# Altium schematic symbol library relay.SCHLIB: 425 symbols (part 1 of 3) (continued)
## GN?*210A
designator K?, comment ULTRA-SMALL PACKAGE SLIM POLARIZED RELAY NAiS   Source: http://www.mew-europe.com/..  en_ds_61007_0000.pdf  (value not drawn)
MPN: AGN210A03; MPN: AGN210A12; MPN: AGN210A4H; MF: AROMAT/ MATSUSHITA; OC_FARNELL: unknown; OC_NEWARK: 15P8571; OC_NEWARK: unknown; OC_NEWARK: 10C3303; OC_NEWARK: 15P8573
footprint GN-A
part A pins: 1 -, 8 +
part B pins: 2 O, 3 P, 4 S
part C pins: 5 S, 6 P, 7 O

## GN?*210S
designator K?, comment ULTRA-SMALL PACKAGE SLIM POLARIZED RELAY NAiS   Source: http://www.mew-europe.com/..  en_ds_61007_0000.pdf  (value not drawn)
MPN: AGN210S03; MPN: AGN210S12; MF: AROMAT/ MATSUSHITA; OC_FARNELL: unknown; OC_NEWARK: 15P8575; OC_NEWARK: unknown; OC_NEWARK: 10C3320
footprint GN-S
part A pins: 1 -, 8 +
part B pins: 2 O, 3 P, 4 S
part C pins: 5 S, 6 P, 7 O

## GQ?*200
designator K?, comment ULTRA-SMALL PACKAGE FLAT POLARIZED RELAY NAiS   Source: http://www.mew-europe.com/..  en_ds_61008_0000.pdf  (value not drawn)
MPN: AGQ20003; MPN: AGQ20006; MPN: AGQ20009; MPN: AGQ20012; MPN: AGQ20024; MPN: AGQ2004H; MF: AROMAT/ MATSUSHITA; OC_FARNELL: unknown; OC_NEWARK: 13P0847; OC_NEWARK: 10C3360; OC_NEWARK: 10C3361; OC_FARNELL: 3104825; OC_NEWARK: 13P0849; OC_NEWARK: unknown; OC_NEWARK: 13P0850; OC_FARNELL: 3104813; OC_NEWARK: 13P0851
footprint GQ
part A pins: 1 +, 8 -
part B pins: 2 O, 3 P, 4 S
part C pins: 5 S, 6 P, 7 O

## GQ?*200A
designator K?, comment ULTRA-SMALL PACKAGE FLAT POLARIZED RELAY NAiS   Source: http://www.mew-europe.com/..  en_ds_61008_0000.pdf  (value not drawn)
MPN: AGQ200A03; MPN: AGQ200A09Z; MPN: AGQ200A12; MPN: AGQ200A24; MPN: AGQ200A4H; MF: AROMAT/ MATSUSHITA; OC_FARNELL: 1448336; OC_NEWARK: 13P0835; OC_FARNELL: unknown; OC_NEWARK: unknown; OC_NEWARK: 10C3339; OC_FARNELL: 3104849; OC_NEWARK: 13P0836; OC_FARNELL: 1448337; OC_NEWARK: 13P0837; OC_FARNELL: 3104837; OC_NEWARK: 13P0838
footprint GN-A
part A pins: 1 +, 8 -
part B pins: 2 O, 3 P, 4 S
part C pins: 5 S, 6 P, 7 O

## GQ?*200S
designator K?, comment ULTRA-SMALL PACKAGE FLAT POLARIZED RELAY NAiS   Source: http://www.mew-europe.com/..  en_ds_61008_0000.pdf  (value not drawn)
MPN: AGQ200S03; MPN: AGQ200S12; MPN: AGQ200S1H; MPN: AGQ200S24; MPN: AGQ200S4H; MF: AROMAT/ MATSUSHITA; OC_FARNELL: unknown; OC_NEWARK: 10C3345; OC_NEWARK: unknown; OC_NEWARK: 10C3353; OC_NEWARK: 13P0842; OC_NEWARK: 10C3355; OC_NEWARK: 10C3357
footprint GN-S
part A pins: 1 +, 8 -
part B pins: 2 O, 3 P, 4 S
part C pins: 5 S, 6 P, 7 O

## GQ?*210
designator K?, comment ULTRA-SMALL PACKAGE FLAT POLARIZED RELAY NAiS   Source: http://www.mew-europe.com/..  en_ds_61008_0000.pdf  (value not drawn)
MPN: AGQ21003; MPN: AGQ21009; MPN: AGQ2101H; MPN: AGQ21024; MPN: AGQ2104H; MF: AROMAT/ MATSUSHITA; OC_FARNELL: unknown; OC_NEWARK: 10C3391; OC_NEWARK: unknown; OC_NEWARK: 15P8586; OC_NEWARK: 10C3394; OC_NEWARK: 10C3396; OC_NEWARK: 15P8587
footprint GQ
part A pins: 1 -, 8 +
part B pins: 2 O, 3 P, 4 S
part C pins: 5 S, 6 P, 7 O

## GQ?*210A
designator K?, comment ULTRA-SMALL PACKAGE FLAT POLARIZED RELAY NAiS   Source: http://www.mew-europe.com/..  en_ds_61008_0000.pdf  (value not drawn)
MPN: AGQ210A03; MPN: AGQ210A1H; MPN: AGQ210A4H; OC_FARNELL: unknown; OC_NEWARK: 15P8580; OC_NEWARK: unknown; OC_NEWARK: 15P8581; OC_NEWARK: 15P8582
footprint GQ-A
part A pins: 1 -, 8 +
part B pins: 2 O, 3 P, 4 S
part C pins: 5 S, 6 P, 7 O

## GQ?*210S
designator K?, comment ULTRA-SMALL PACKAGE FLAT POLARIZED RELAY NAiS   Source: http://www.mew-europe.com/..  en_ds_61008_0000.pdf  (value not drawn)
MPN: AGQ210S4H; OC_FARNELL: unknown; OC_NEWARK: unknown; OC_NEWARK: 15P8583
footprint GN-S
part A pins: 1 -, 8 +
part B pins: 2 O, 3 P, 4 S
part C pins: 5 S, 6 P, 7 O

## H550
designator K?, comment RELAY   bistable, 1 x switch, high current  (value not drawn)
OC_FARNELL: unknown; OC_NEWARK: unknown
footprint H550
part A pins: 1, 2, 3
part B pins: O0 O, O1 O@1, P0 P@1, P1 P, S0 S, S1 S@1

## HE751
designator K?, comment RELAY   reed, 1 x norm. open, Hamlin  (value not drawn)
OC_FARNELL: unknown; OC_NEWARK: unknown
footprint HE751
part A pins: 2 1, 6 2
part B pins: 8 P, 14 S

## HE3321
designator K?, comment RELAY   reed, 1 x norm. open, 7.62 mm, grid 5.08 mm, Hamlin  (value not drawn)
MPN: HE3321C1200; MF: HAMLIN; OC_FARNELL: unknown; OC_NEWARK: 46F3928
footprint HE3321
part A pins: 2 1, 3 2
part B pins: 1 P, 4 S

## HE3621
designator K?, comment RELAY   reed, 1 x norm. open, grid 5.08 mm, Hamlin  (value not drawn)
MPN: HE3621A2410; MF: HAMLIN; OC_FARNELL: 9561943; OC_NEWARK: 50F7993
footprint HE3621
part A pins: 2 +, 3 -
part B pins: 1 S, 4 P

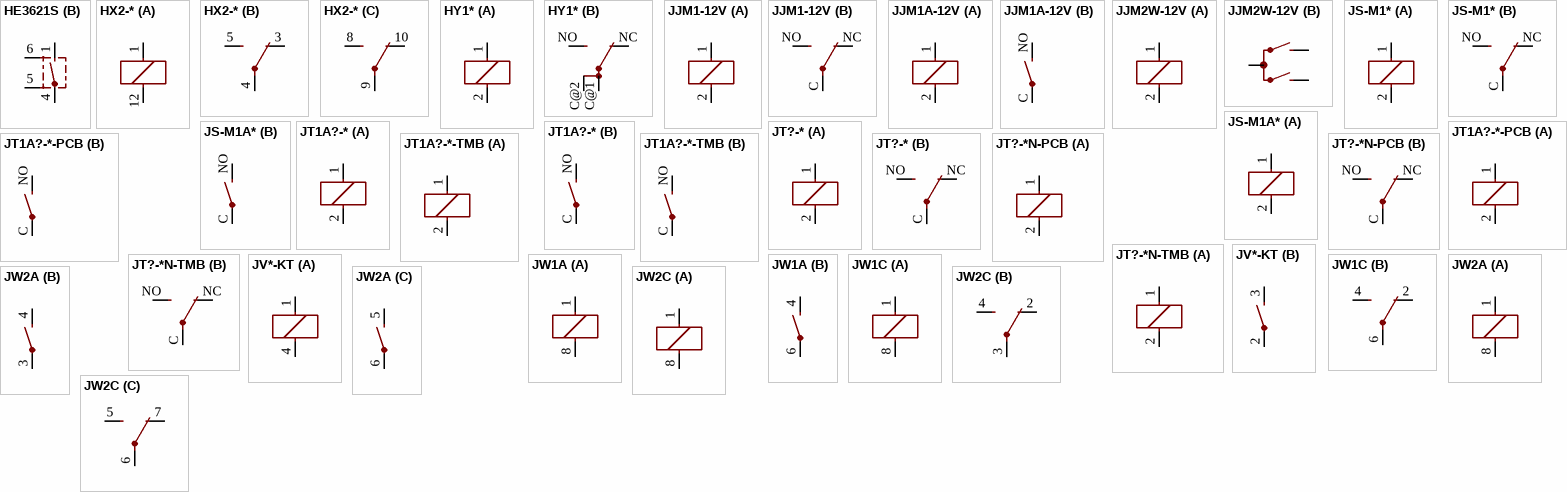
[diagram p10: symbols HE3621S to JW2C]

## HE3621S
designator K?, comment RELAY   reed, 1 x norm. open with shield, grid 5.08 mm, Hamlin  (value not drawn)
OC_FARNELL: unknown; OC_NEWARK: unknown
footprint HE3621S
part A pins: 2 +, 3 -
part B pins: 1 S, 4 P, 5 ES@1, 6 ES@2

## HX2-*
designator K?, comment Compact & Slim 2 Form C Non-polarized Relay NAiS   Source: http://www.mew-europe.com/..  en_ds_61011_0000.pdf  (value not drawn)
OC_FARNELL: unknown; OC_NEWARK: unknown
footprint HX
part A pins: 1, 12 2
part B pins: 3 O, 4 P, 5 S
part C pins: 8 S, 9 P, 10 O

## HY1*
designator K?, comment Non-polarized 1 Form C Relay NAiS   Source: http://www.mew-europe.com/..  en_ds_61012_0000.pdf  (value not drawn)
MPN: HY1-12V; MPN: HY1-24V; MPN: HY1-3V; MPN: HY1-5V; MPN: HY1-6V; MPN: HY1-9V; MPN: HY1Z-12V; MPN: HY1Z-24V; MPN: HY1Z-4.5V; MPN: HY1Z-5V; MPN: HY1Z-9V; MF: AROMAT/ MATSUSHITA; OC_FARNELL: unknown; OC_NEWARK: unknown; OC_NEWARK: 10C6688; OC_NEWARK: 10C6689; OC_NEWARK: 10C6690; OC_NEWARK: 10C6692; OC_NEWARK: 10C6693; OC_NEWARK: 10C6694; OC_NEWARK: 10C6704; OC_NEWARK: 10C6705; OC_NEWARK: 10C6707; OC_NEWARK: 52F9234; OC_NEWARK: 10C6709
footprint HY
part A pins: 1, 2
part B pins: C@1 P, C@2 P@1, NC O, NO S

## JJM1-12V
designator K?, comment HALF-SIZE AUTOMOTIVE RELAY NAiS   Source: http://www.mew-europe.com/.. en_ds_61210_0001.pdf  (value not drawn)
MPN: JJM1-12V; MF: AROMAT/ MATSUSHITA; OC_FARNELL: unknown; OC_NEWARK: 10C7318
footprint JJM1C
part A pins: 1, 2
part B pins: C P, NC O, NO S

## JJM1A-12V
designator K?, comment HALF-SIZE AUTOMOTIVE RELAY NAiS   Source: http://www.mew-europe.com/.. en_ds_61210_0001.pdf  (value not drawn)
OC_FARNELL: unknown; OC_NEWARK: unknown
footprint JJM1A
part A pins: 1, 2
part B pins: C P, NO S

## JJM2W-12V
designator K?, comment DOUBLE MAKE CONTACT AUTOMOTIVE RELAY NAiS   Source: http://www.mew-europe.com/.. en_ds_61210_0002.pdf  (value not drawn)
OC_FARNELL: unknown; OC_NEWARK: unknown
footprint JJM
part A pins: 1, 2
part B pins: C, NO1, NO2

## JS-M1*
designator K?, comment Automotive Ultra-Miniature Power Relay NAiS   Source: http://www.mew-europe.com/.. en_ds_61211_0000.pdf  (value not drawn)
MPN: JSM1-12V-4; MPN: JSM1-12V-5; MF: FARNELL; OC_FARNELL: 910338; OC_NEWARK: 13P4552; OC_FARNELL: 910351; OC_NEWARK: 14J1764; OC_FARNELL: unknown; OC_NEWARK: unknown
footprint JS-M
part A pins: 1, 2
part B pins: C P, NC O, NO S

## JS-M1A*
designator K?, comment Automotive Ultra-Miniature Power Relay NAiS   Source: http://www.mew-europe.com/.. en_ds_61211_0000.pdf  (value not drawn)
MPN: JSM1A-12V-4; MPN: JSM1A-12V-5; OC_FARNELL: unknown; OC_NEWARK: 13P4554; OC_NEWARK: 13P4555; OC_NEWARK: unknown
footprint JS-M1A
part A pins: 1, 2
part B pins: C P, NO S

## JT1A?-*
designator K?, comment COMPACT ECONOMICAL 30 AMP. RELAY NAiS   Source: http://www.mew-europe.com/.. en_ds_61212_0000.pdf  (value not drawn)
OC_FARNELL: unknown; OC_NEWARK: unknown
footprint JT1A
part A pins: 1, 2
part B pins: C P, NO S

## JT1A?-*-PCB
designator K?, comment COMPACT ECONOMICAL 30 AMP. RELAY NAiS   Source: http://www.mew-europe.com/.. en_ds_61212_0000.pdf  (value not drawn)
OC_FARNELL: unknown; OC_NEWARK: unknown
footprint JT1A-PCB
part A pins: 1, 2
part B pins: C P, NO S

## JT1A?-*-TMB
designator K?, comment COMPACT ECONOMICAL 30 AMP. RELAY NAiS   Source: http://www.mew-europe.com/.. en_ds_61212_0000.pdf  (value not drawn)
OC_FARNELL: unknown; OC_NEWARK: unknown
footprint JT1A-TMB
part A pins: 1, 2
part B pins: C P, NO S

## JT?-*
designator K?, comment COMPACT ECONOMICAL 30 AMP. RELAY NAiS   Source: http://www.mew-europe.com/.. en_ds_61212_0000.pdf  (value not drawn)
OC_FARNELL: unknown; OC_NEWARK: unknown
footprint JT
part A pins: 1, 2
part B pins: C P, NC O, NO S

## JT?-*N-PCB
designator K?, comment COMPACT ECONOMICAL 30 AMP. RELAY NAiS   Source: http://www.mew-europe.com/.. en_ds_61212_0000.pdf  (value not drawn)
OC_FARNELL: unknown; OC_NEWARK: unknown
footprint JT-PCB
part A pins: 1, 2
part B pins: C P, NC O, NO S

## JT?-*N-TMB
designator K?, comment COMPACT ECONOMICAL 30 AMP. RELAY NAiS   Source: http://www.mew-europe.com/.. en_ds_61212_0000.pdf  (value not drawn)
OC_FARNELL: unknown; OC_NEWARK: unknown
footprint JT-TMB
part A pins: 1, 2
part B pins: C P, NC O, NO S

## JV*-KT
designator K?, comment POWER RELAY JV SERIES 1 POLEâ€”5 A (MEDIUM LOAD CONTROL)    Source:  Data sheet  (value not drawn)
footprint JV-KT
part A pins: 1, 4 2
part B pins: 2 P, 3 S

## JW1A
designator K?, comment Power relay   Source: Panasonic Electric Works Co., Ltd. / jw.catalog.pdf  (value not drawn)
footprint JW1A
part A pins: 1, 8 2
part B pins: 4 S, 6 P

## JW1C
designator K?, comment Power relay   Source: Panasonic Electric Works Co., Ltd. / jw.catalog.pdf  (value not drawn)
footprint JW1C
part A pins: 1, 8 2
part B pins: 2 O, 4 S, 6 P

## JW2A
designator K?, comment Power relay   Source: Panasonic Electric Works Co., Ltd. / jw.catalog.pdf  (value not drawn)
footprint JW2A
part A pins: 1, 8 2
part B pins: 3 P, 4 S
part C pins: 5 S, 6 P

## JW2C
designator K?, comment Power relay   Source: Panasonic Electric Works Co., Ltd. / jw.catalog.pdf  (value not drawn)
footprint JW2C
part A pins: 1, 8 2
part B pins: 2 O, 3 P, 4 S
part C pins: 5 S, 6 P, 7 O

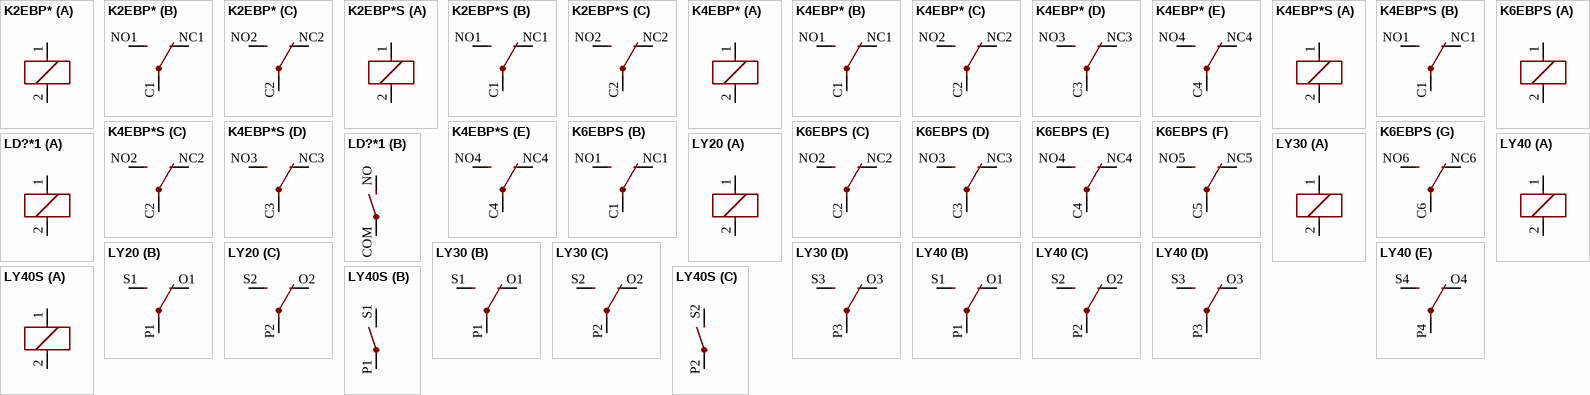
[diagram p11: symbols K2EBP* to LY40S]

## K2EBP*
designator K?, comment UNIQUELY DESIGNED RELAY NAiS   Source: http://www.mew-europe.com/..  en_ds_61013_0000.pdf  (value not drawn)
OC_FARNELL: unknown; OC_NEWARK: unknown
footprint K2EBP
part A pins: 1, 2
part B pins: C1 P, NC1 O, NO1 S
part C pins: C2 P, NC2 O, NO2 S

## K2EBP*S
designator K?, comment UNIQUELY DESIGNED RELAY NAiS   Source: http://www.mew-europe.com/..  en_ds_61013_0000.pdf  (value not drawn)
OC_FARNELL: unknown; OC_NEWARK: unknown
footprint K2-PS
part A pins: 1, 2
part B pins: C1 P, NC1 O, NO1 S
part C pins: C2 P, NC2 O, NO2 S

## K4EBP*
designator K?, comment UNIQUELY DESIGNED RELAY NAiS   Source: http://www.mew-europe.com/..  en_ds_61013_0000.pdf  (value not drawn)
OC_FARNELL: unknown; OC_NEWARK: unknown
footprint K4EBP
part A pins: 1, 2
part B pins: C1 P, NC1 O, NO1 S
part C pins: C2 P, NC2 O, NO2 S
part D pins: C3 P, NC3 O, NO3 S
part E pins: C4 P, NC4 O, NO4 S

## K4EBP*S
designator K?, comment UNIQUELY DESIGNED RELAY NAiS   Source: http://www.mew-europe.com/..  en_ds_61013_0000.pdf  (value not drawn)
OC_FARNELL: unknown; OC_NEWARK: unknown
footprint K4-PS
part A pins: 1, 2
part B pins: C1 P, NC1 O, NO1 S
part C pins: C2 P, NC2 O, NO2 S
part D pins: C3 P, NC3 O, NO3 S
part E pins: C4 P, NC4 O, NO4 S

## K6EBPS
designator K?, comment RELAY Socked NAiS   Source: http://www.mew-europe.com/..  en_ds_61013_0000.pdf  (value not drawn)
OC_FARNELL: unknown; OC_NEWARK: unknown
footprint K6-PS
part A pins: 1, 2
part B pins: C1 P, NC1 O, NO1 S
part C pins: C2 P, NC2 O, NO2 S
part D pins: C3 P, NC3 O, NO3 S
part E pins: C4 P, NC4 O, NO4 S
part F pins: C5 P, NC5 O, NO5 S
part G pins: C6 P, NC6 O, NO6 S

## LD?*1
designator K?, comment Slim Power Relay NAiS   Source: http://www.mew-europe.com/..  en_ds_61112_0000.pdf  (value not drawn)
MPN: ALD112; MF: FARNELL; OC_FARNELL: 3727154; OC_NEWARK: unknown; OC_FARNELL: unknown; OC_FARNELL: 3727166; OC_NEWARK: 70C6003; OC_FARNELL: 3727178
footprint LD
part A pins: 1, 2
part B pins: COM P, NO S

## LY20
designator K?, comment RELAY   2 x switch, Omron  (value not drawn)
OC_FARNELL: unknown; OC_NEWARK: unknown
footprint LY20
part A pins: 1, 2
part B pins: O1 O, P1 P, S1 S
part C pins: O2 O, P2 P, S2 S

## LY30
designator K?, comment RELAY   3 x switch, Omron  (value not drawn)
OC_FARNELL: unknown; OC_NEWARK: unknown
footprint LY30
part A pins: 1, 2
part B pins: O1 O, P1 P, S1 S
part C pins: O2 O, P2 P, S2 S
part D pins: O3 O, P3 P, S3 S

## LY40
designator K?, comment RELAY   4 x switch, Omron  (value not drawn)
OC_FARNELL: unknown; OC_NEWARK: unknown
footprint LY40
part A pins: 1, 2
part B pins: O1 O, P1 P, S1 S
part C pins: O2 O, P2 P, S2 S
part D pins: O3 O, P3 P, S3 S
part E pins: O4 O, P4 P, S4 S

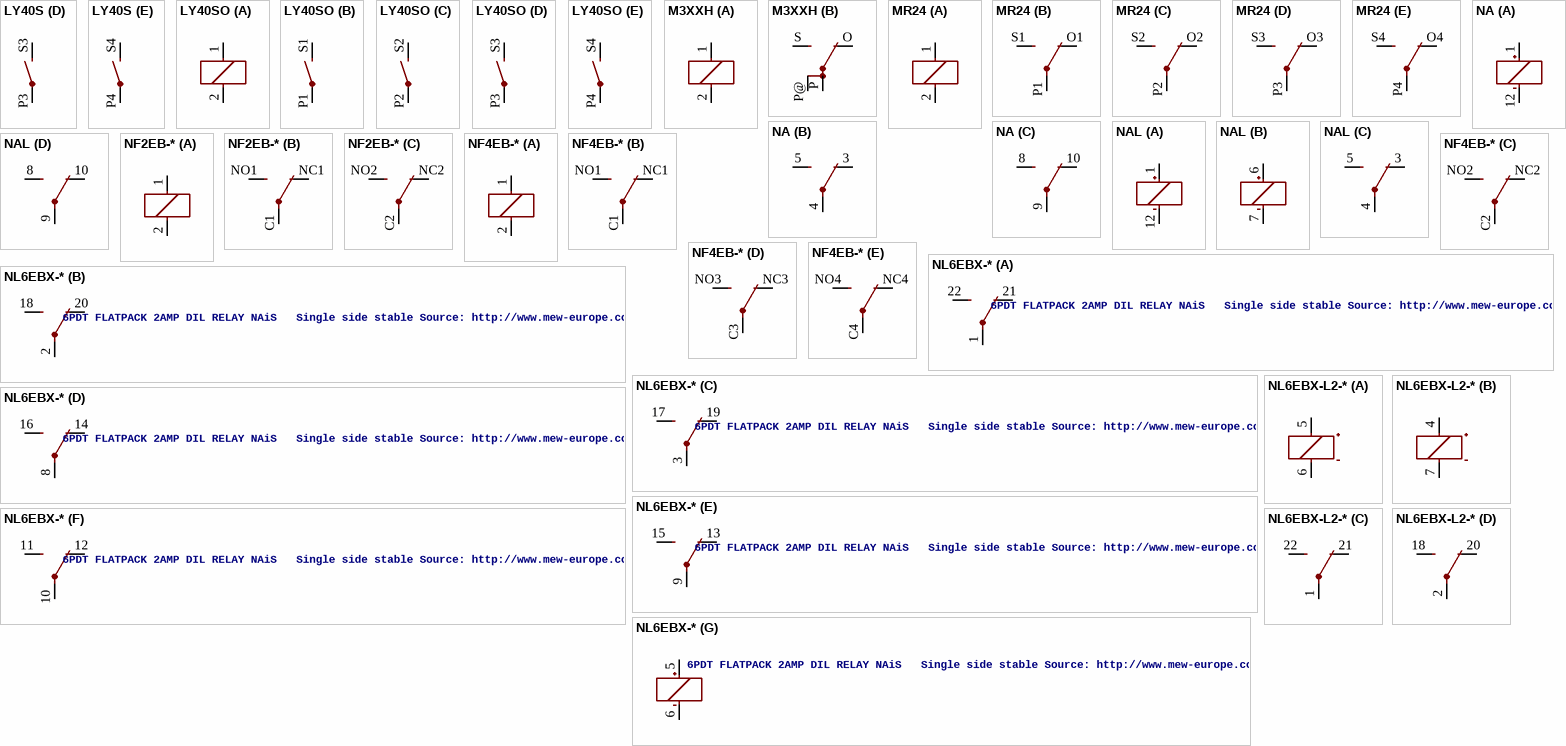
[diagram p12: symbols LY40S to NL6EBX-L2-*]

## LY40S
designator K?, comment RELAY   4 x switch, Omron  (value not drawn)
OC_FARNELL: unknown; OC_NEWARK: unknown
footprint LY40S
part A pins: 1, 2
part B pins: P1 P, S1 S
part C pins: P2 P, S2 S
part D pins: P3 P, S3 S
part E pins: P4 P, S4 S

## LY40SO
designator K?, comment RELAY   4 x norm. open, Omron  (value not drawn)
OC_FARNELL: unknown; OC_NEWARK: unknown
footprint LY40SO
part A pins: 1, 2
part B pins: P1 P, S1 S
part C pins: P2 P, S2 S
part D pins: P3 P, S3 S
part E pins: P4 P, S4 S

## M3XXH
designator K?, comment RELAY   1 x switch  (value not drawn)
OC_FARNELL: unknown; OC_NEWARK: unknown
footprint M3XXH
part A pins: 1, 2
part B pins: O, P, P@ P@1, S

## MR24
designator K?, comment RELAY   4 x switch  (value not drawn)
OC_FARNELL: unknown; OC_NEWARK: unknown
footprint MR24
part A pins: 1, 2
part B pins: O1 O, P1 P, S1 S
part C pins: O2 O, P2 P, S2 S
part D pins: O3 O, P3 P, S3 S
part E pins: O4 O, P4 P, S4 S

## NA
designator K?, comment RELAY  (value not drawn)
OC_FARNELL: unknown; OC_NEWARK: unknown
footprint NA
part A pins: 1 +, 12 -
part B pins: 3 O, 4 P, 5 S
part C pins: 8 S, 9 P, 10 O

## NAL
designator K?, comment RELAY  (value not drawn)
OC_FARNELL: unknown; OC_NEWARK: unknown
footprint NAL
part A pins: 1 +, 12 -
part B pins: 6 +, 7 -
part C pins: 3 O, 4 P, 5 S
part D pins: 8 S, 9 P, 10 O

## NF2EB-*
designator K?, comment FLATPACK RELAY NAiS   Source: http://www.mew-europe.com/..  en_ds_61014_0000.pdf  (value not drawn)
MPN: NF2EB-12V; MPN: NF2EB-24V; MPN: NF2EB-5V; MPN: NF2EB-6V; OC_FARNELL: 1200946; OC_NEWARK: 13P5536; OC_FARNELL: 1175714; OC_NEWARK: 13P5537; OC_FARNELL: unknown; OC_NEWARK: unknown; OC_FARNELL: 1703747; OC_NEWARK: 13P5538; OC_NEWARK: 13P5539
footprint NF2
part A pins: 1, 2
part B pins: C1 P, NC1 O, NO1 S
part C pins: C2 P, NC2 O, NO2 S

## NF4EB-*
designator K?, comment FLATPACK RELAY NAiS   Source: http://www.mew-europe.com/..  en_ds_61014_0000.pdf  (value not drawn)
MPN: NF4EB-12V; MPN: NF4EB-24V; MPN: NF4EB-48V; MPN: NF4EB-5V; MPN: NF4EB-6V; MF: AROMAT/ MATSUSHITA; OC_FARNELL: 1175715; OC_NEWARK: 13P5540; OC_FARNELL: 1373470; OC_NEWARK: 13P5541; OC_FARNELL: unknown; OC_NEWARK: 13P5542; OC_FARNELL: 1200947; OC_NEWARK: 13P5543; OC_NEWARK: 46F5739
footprint NF4
part A pins: 1, 2
part B pins: C1 P, NC1 O, NO1 S
part C pins: C2 P, NC2 O, NO2 S
part D pins: C3 P, NC3 O, NO3 S
part E pins: C4 P, NC4 O, NO4 S

## NL6EBX-*
designator K?, comment 6PDT FLATPACK 2AMP DIL RELAY NAiS   Single side stable Source: http://www.mew-europe.com/..  en_ds_61014_0003.pdf
OC_FARNELL: unknown; OC_NEWARK: unknown
footprint NL6EBX
part A pins: 1 P, 21 O, 22 S
part B pins: 2 P, 18 S, 20 O
part C pins: 3 P, 17 S, 19 O
part D pins: 8 P, 14 O, 16 S
part E pins: 9 P, 13 O, 15 S
part F pins: 10 P, 11 S, 12 O
part G pins: 5 +, 6 -

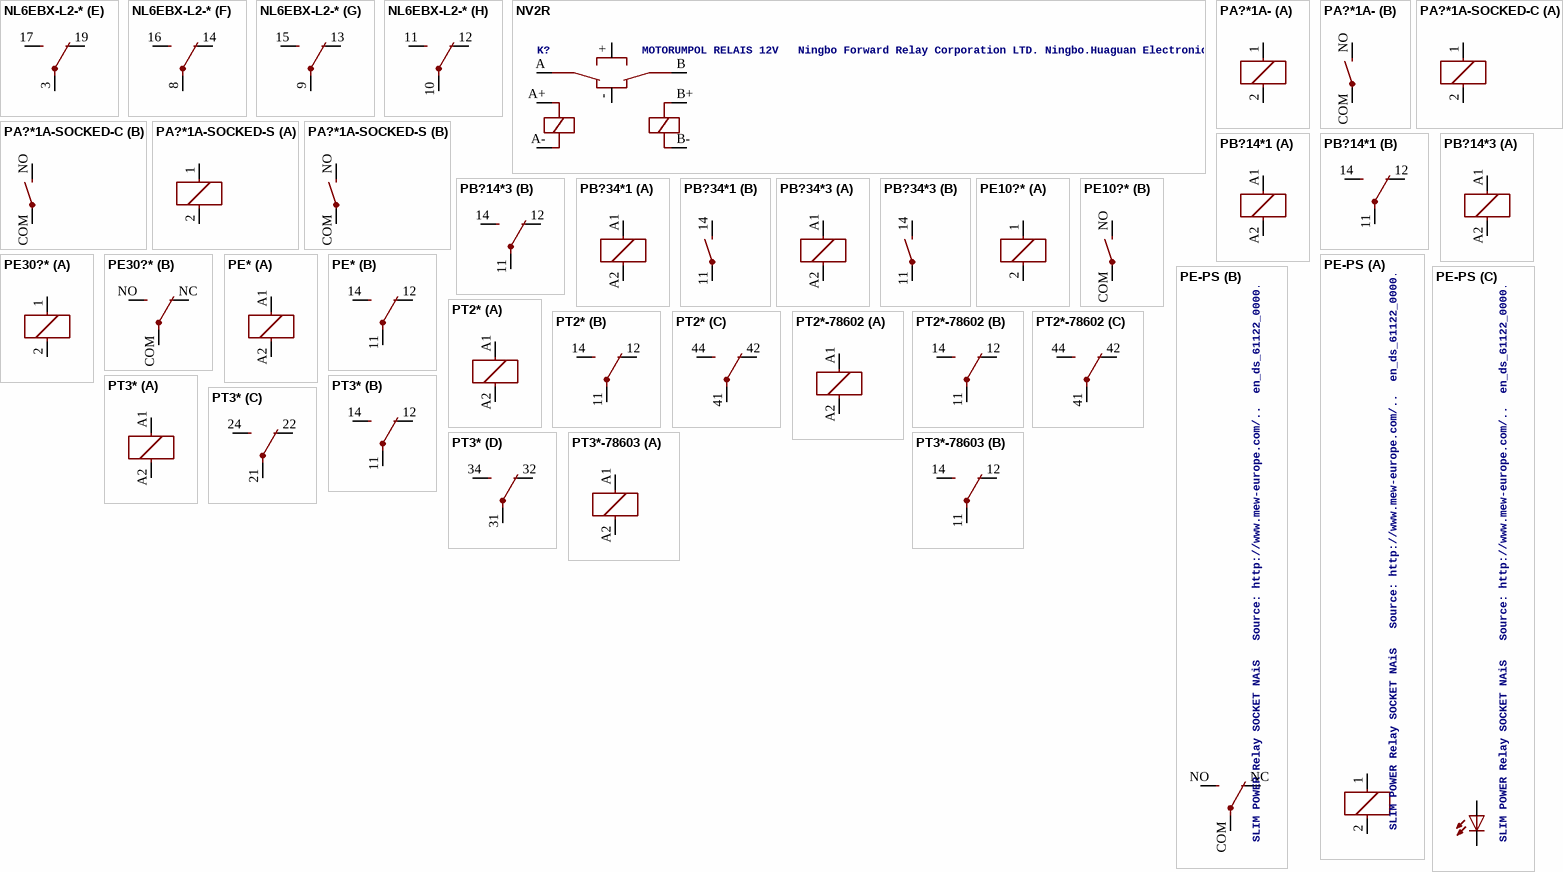
[diagram p13: symbols NL6EBX-L2-* to PT3*-78603]

## NL6EBX-L2-*
designator K?, comment 6PDT FLATPACK 2AMP DIL RELAY NAiS   2 coil latching Source: http://www.mew-europe.com/..  en_ds_61014_0003.pdf  (value not drawn)
OC_FARNELL: unknown; OC_NEWARK: unknown
footprint NL6EBX-L2
part A pins: 5 +, 6 -
part B pins: 4 +, 7 -
part C pins: 1 P, 21 O, 22 S
part D pins: 2 P, 18 S, 20 O
part E pins: 3 P, 17 S, 19 O
part F pins: 8 P, 14 O, 16 S
part G pins: 9 P, 13 O, 15 S
part H pins: 10 P, 11 S, 12 O

## NV2R
designator K?, comment MOTORUMPOL RELAIS 12V   Ningbo Forward Relay Corporation LTD. Ningbo.Huaguan Electronics Corporation LTD.   Source: http://www.dblectro.com/site/pdf/NV2R.pdf   http://www2.produktinfo.conrad.com/datenblaetter/500000-524999/505013-da-01-de-Motorumpolrelais_12V.pdf Elli-Echo ER20T-S-DC12V - 20A/14VDC Conrad Nr.: 505013 - 62
OC_FARNELL: unknown; OC_NEWARK: unknown
footprint NV2R
pins: +, -, A, A+, A-, B, B+, B-

## PA?*1A-
designator K?, comment SLIM POWER RELAY NAiS   Source: http://www.mew-europe.com/..  en_ds_61123_0000.pdf  (value not drawn)
MPN: PA1A-12V-Y1; MPN: PA1A-18V; MPN: PA1A-24V; MF: AROMAT/ MATSUSHITA; OC_FARNELL: 910363; OC_NEWARK: 82H8374; OC_FARNELL: unknown; OC_NEWARK: 92B3524; OC_FARNELL: 910375; OC_NEWARK: 13P6167; OC_NEWARK: unknown
footprint PA
part A pins: 1, 2
part B pins: COM P, NO S

## PA?*1A-SOCKED-C
designator K?, comment SLIM POWER RELAY NAiS   Source: http://www.mew-europe.com/..  en_ds_61123_0000.pdf  (value not drawn)
OC_FARNELL: unknown; OC_NEWARK: unknown
footprint PA-CLI-SOCKET
part A pins: 1, 2
part B pins: COM P, NO S

## PA?*1A-SOCKED-S
designator K?, comment SLIM POWER RELAY NAiS   Source: http://www.mew-europe.com/..  en_ds_61123_0000.pdf  (value not drawn)
OC_FARNELL: unknown; OC_NEWARK: unknown
footprint PA-STD-SOCKET
part A pins: 1, 2
part B pins: COM P, NO S

## PB?14*1
designator K?, comment Miniature Power PCB Relay SCHRACK   1pole 10 A Source: http://www.schrack.com/.. 5846.pdf  (value not drawn)
MPN: PB114006; MPN: PB114012; MPN: PB114024; MF: TYCO ELECTRONICS; OC_FARNELL: 1175076; OC_NEWARK: 85C1482; OC_FARNELL: 1175077; OC_NEWARK: 34K8593; OC_FARNELL: 1175078; OC_NEWARK: 34K8594
footprint PB
part A pins: A1 1, A2 2
part B pins: 11 P, 12 O, 14 S

## PB?14*3
designator K?, comment Miniature Power PCB Relay SCHRACK   1pole 10 A Source: http://www.schrack.com/.. 5846.pdf  (value not drawn)
OC_FARNELL: unknown; OC_NEWARK: unknown
footprint PB
part A pins: A1 1, A2 2
part B pins: 11 P, 12 O, 14 S

## PB?34*1
designator K?, comment Miniature Power PCB Relay SCHRACK   1pole 10 A Source: http://www.schrack.com/.. 5846.pdf  (value not drawn)
OC_FARNELL: unknown; OC_NEWARK: unknown
footprint PB
part A pins: A1 1, A2 2
part B pins: 11 P, 14 S

## PB?34*3
designator K?, comment Miniature Power PCB Relay SCHRACK   1pole 10 A Source: http://www.schrack.com/.. 5846.pdf  (value not drawn)
OC_FARNELL: unknown; OC_NEWARK: unknown
footprint PB
part A pins: A1 1, A2 2
part B pins: 11 P, 14 S